# Altium footprint library tik_handheld_pcblib.PcbLib: 46 footprints (part 2 of 3)
Each footprint in its own frame and in the unit in brackets; x right, y up, seen from the top. Pads: shape width x height; smd on the part's side, far side on the other; paste and mask are expansions set on the pad; w line width, h text height; cw(c..) or ccw(c..) is an arc to the next point about the centre after c.
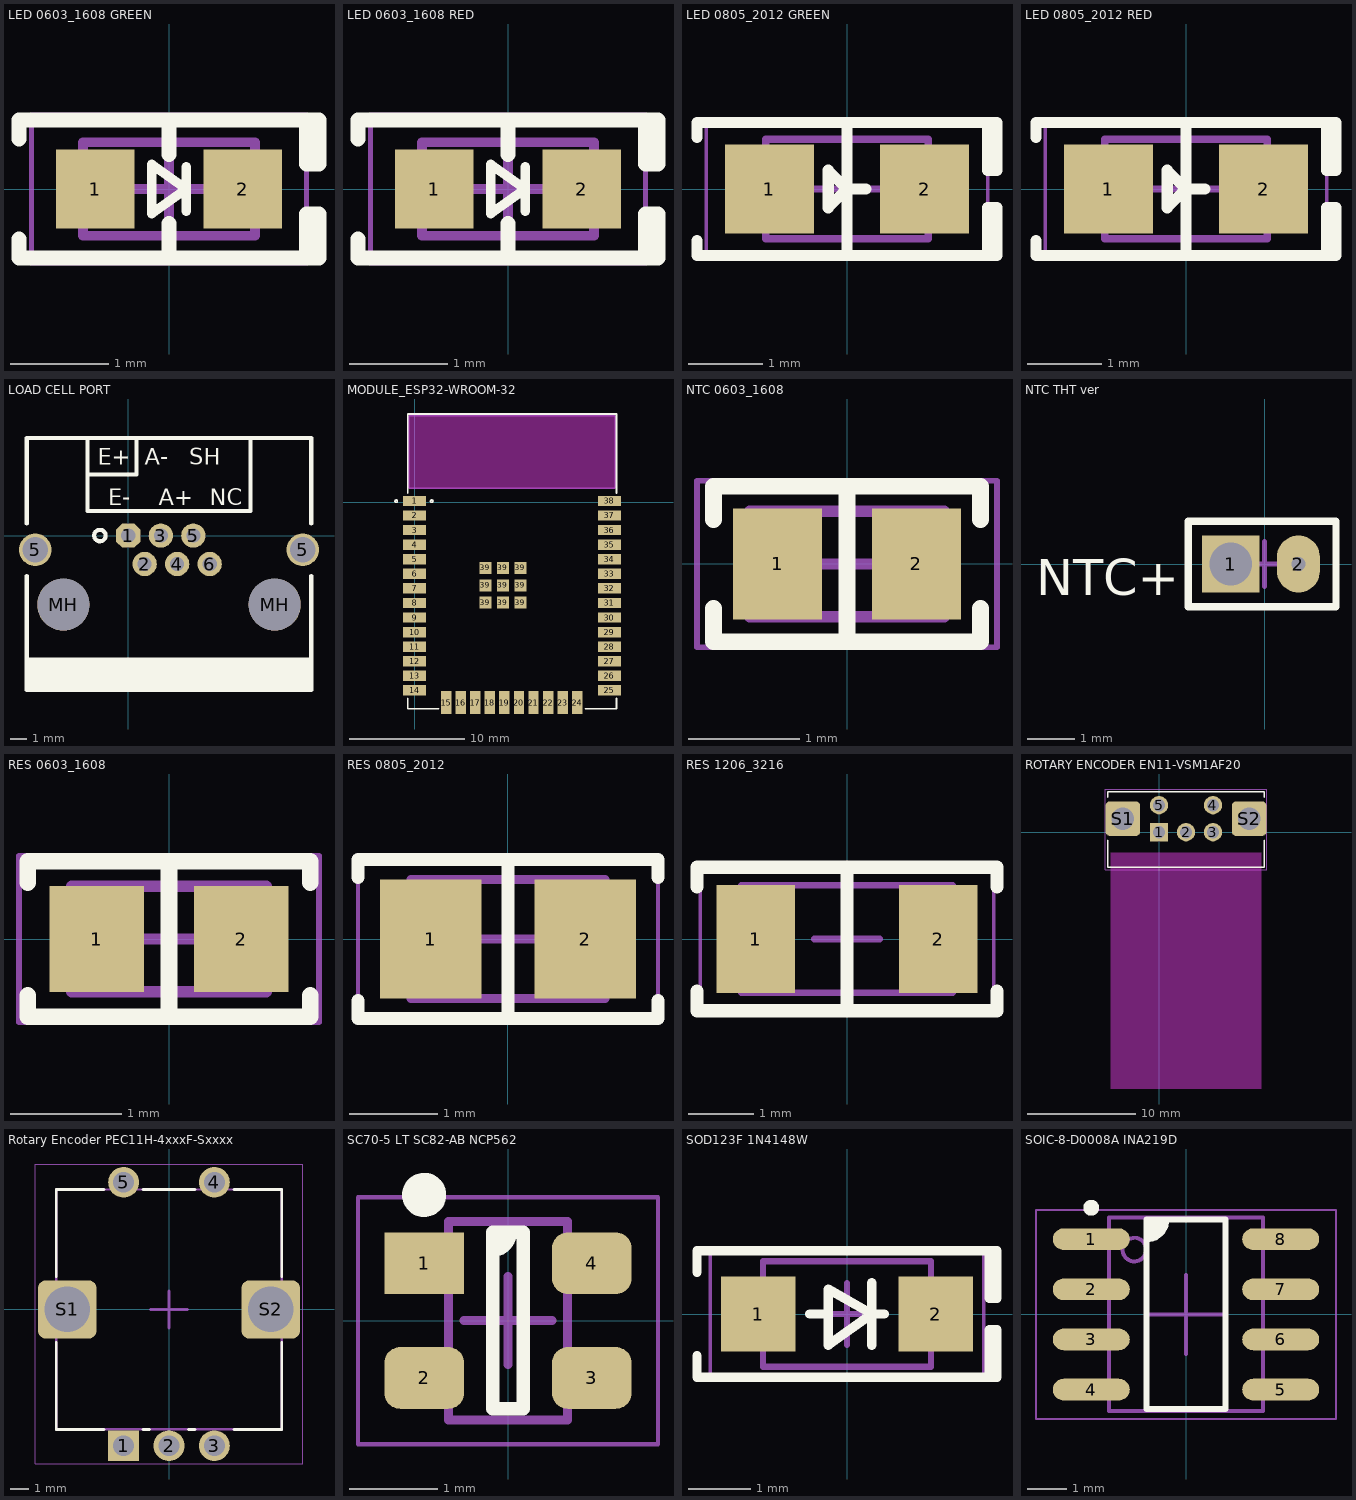
[diagram p1: the footprints below, top view; thin cyan lines are the x and y axes]

## LED 0603_1608 GREEN [mm] "Chip Diode, 2-Leads, Body 1.60x0.80mm, IPC Medium Density"
height 0.45
pads (2):
  rect 0.8x0.8 smd: 1(-0.75,0) 2(0.75,0)
Top Overlay:
  lines w0.1: 0.175,-0.225 0.175,0 ; 0.175,0.225 0.175,0 ; 0.175,0 -0.175,0.25 -0.175,0 -0.175,-0.25 0.175,0
  lines w0.15: -1.524,-0.508 -1.524,-0.7 1.5,-0.7 ; -1.524,0.508 -1.524,0.7 1.5,0.7 ; 0,-0.7 0,-0.35 ; 0,0.35 0,0.7 ; 1.397,-0.7 1.397,-0.254 1.524,-0.254 1.524,-0.7 1.397,-0.7 ; 1.397,0.254 1.397,0.7 1.524,0.7 1.524,0.254 1.397,0.254
Mechanical 13:
  lines w0.1: -0.875,-0.475 0.875,-0.475 0.875,0.475 -0.875,0.475 -0.875,-0.475
Mechanical 15:
  lines w0.05: -1.397,-0.75 1.397,-0.75 1.397,0.75 -1.397,0.75 -1.397,-0.75
  lines w0.1: -0.475,0 0.475,0 ; 0,-0.475 0,0.475
3D body "LED 0603 Base GREEN.STEP": height 0.28, standoff 0, extent -0.8,-0.4 0.8,0.4
3D body "LED 0603 Lens GREEN.STEP": height 0.53, standoff 0.18, extent -0.55,-0.4 0.55,0.4

## LED 0603_1608 RED [mm] "Chip Diode, 2-Leads, Body 1.60x0.80mm, IPC Medium Density"
height 0.45
pads (2):
  rect 0.8x0.8 smd: 1(-0.75,0) 2(0.75,0)
Top Overlay:
  lines w0.1: 0.175,-0.225 0.175,0 ; 0.175,0.225 0.175,0 ; 0.175,0 -0.175,-0.25 -0.175,0 -0.175,0.25 0.175,0
  lines w0.15: -1.524,-0.508 -1.524,-0.7 1.5,-0.7 ; -1.524,0.508 -1.524,0.7 1.5,0.7 ; 0,-0.7 0,-0.35 ; 0,0.35 0,0.7 ; 1.397,-0.7 1.397,-0.254 1.524,-0.254 1.524,-0.7 1.397,-0.7 ; 1.397,0.254 1.397,0.7 1.524,0.7 1.524,0.254 1.397,0.254
Mechanical 13:
  lines w0.1: -0.875,-0.475 0.875,-0.475 0.875,0.475 -0.875,0.475 -0.875,-0.475
Mechanical 15:
  lines w0.05: -1.397,-0.75 1.397,-0.75 1.397,0.75 -1.397,0.75 -1.397,-0.75
  lines w0.1: -0.475,0 0.475,0 ; 0,-0.475 0,0.475
3D body "LED 0603 Base RED.STEP": height 0.28, standoff 0, extent -0.8,-0.4 0.8,0.4
3D body "LED 0603 Lens RED.STEP": height 0.53, standoff 0.18, extent -0.55,-0.4 0.55,0.4

## LED 0805_2012 GREEN [mm] "Chip Diode, 2-Leads, Body 2.00x1.25mm, IPC Medium Density"
height 0.7
pads (2):
  rect 1.2x1.2 smd: 1(-1.05,0) 2(1.05,0)
Top Overlay:
  lines w0.15: -2.032,-0.7 -2.032,-0.9 1.905,-0.9 ; -2.032,0.7 -2.032,0.9 1.905,0.9 ; 0,-0.9 0,0.9 ; 0.254,0 0,0 ; 0,0 -0.254,0.254 -0.254,-0.254 0,0 ; 1.905,-0.9 1.905,-0.254 2.032,-0.254 2.032,-0.9 1.905,-0.9 ; 1.905,0.9 1.905,0.254 2.032,0.254 2.032,0.9 1.905,0.9
Mechanical 13:
  lines w0.1: -1.1,-0.675 1.1,-0.675 1.1,0.675 -1.1,0.675 -1.1,-0.675
Mechanical 15:
  lines w0.05: -1.905,-0.95 1.905,-0.95 1.905,0.95 -1.905,0.95 -1.905,-0.95
  lines w0.1: -0.5,0 0.5,0 ; 0,-0.5 0,0.5
3D body "LED 0805 Base GREEN.STEP": height 0.4, standoff 0, extent -1,-0.625 1,0.625
3D body "LED 0805 Lens GREEN.STEP": height 0.9, standoff 0.3, extent -0.65,-0.625 0.65,0.625

## LED 0805_2012 RED [mm] "Chip Diode, 2-Leads, Body 2.00x1.25mm, IPC Medium Density"
height 0.7
pads (2):
  rect 1.2x1.2 smd: 1(-1.05,0) 2(1.05,0)
Top Overlay:
  lines w0.15: -2.032,-0.7 -2.032,-0.9 1.905,-0.9 ; -2.032,0.7 -2.032,0.9 1.905,0.9 ; 0,-0.9 0,0.9 ; 0.254,0 0,0 ; 0,0 -0.254,0.254 -0.254,-0.254 0,0 ; 1.905,-0.9 2.032,-0.9 2.032,-0.254 1.905,-0.254 1.905,-0.9 ; 1.905,0.9 2.032,0.9 2.032,0.254 1.905,0.254 1.905,0.9
Mechanical 13:
  lines w0.1: -1.1,-0.675 -1.1,0.675 1.1,0.675 1.1,-0.675 -1.1,-0.675
Mechanical 15:
  lines w0.05: -1.905,-0.95 -1.905,0.95 1.905,0.95 1.905,-0.95 -1.905,-0.95
  lines w0.1: -0.5,0 0.5,0 ; 0,-0.5 0,0.5
3D body "LED 0805 Lens RED.STEP": height 0.9, standoff 0.3, extent -0.65,-0.625 0.65,0.625
3D body "LED 0805 Base RED.STEP": height 0.4, standoff 0, extent -1,-0.625 1,0.625

## LOAD CELL PORT [mil]
pads (10):
  oct 60x60 hole 35: 1(0,0)
  round 60 hole 35: 2(40,-70) 3(80,0) 4(120,-70) 5(160,0) 6(200,-70)
  round 80 hole 62: 5(-229,-35) 5(429,-35)
  round 128 hole 128 unplated: MH(-160,-170)
  round 128 hole 128: MH(360,-170)
Top Overlay:
  circle w10: c-70,0 r14.14
  rectangle: -250,-380 450,-300
  lines w10: -250,-100 -250,-380 450,-380 450,-100 ; -250,30 -250,240 450,240 450,30 ; -100,150 20,150 20,240 ; -100,60 300,60 300,240 -100,240 -100,60
  text "NC" at 200,74.01 h40
  text "E+" at -75,174.01 h40
  text "E-" at -50,74.01 h40
  text "A-" at 40,174.01 h40
  text "A+" at 75,74.01 h40
  text "SH" at 150,174.01 h40
Bottom Overlay:
  circle w10: c-70,0 r14.14
  lines w10: -100,150 20,150 20,240 ; -100,60 300,60 300,240 -100,240 -100,60
  text "E-" at 28.74,74.01 h40
  text "A+" at 153.74,74.01 h40
  text "NC" at 278.74,74.01 h40
  text "SH" at 228.74,174.01 h40
  text "A-" at 118.74,174.01 h40
  text "E+" at 3.74,174.01 h40
3D body "438600026.stp": height 524.5, standoff -143.92, extent -250.75,-377.99 450.76,241.51

## MODULE_ESP32-WROOM-32 [mm]
pads (47):
  rect 2x0.9 smd: 1(0,0.121) 2(0,-1.149) 3(0,-2.419) 4(0,-3.689) 5(0,-4.959) 6(0,-6.229) 7(0,-7.504) 8(0,-8.779) 9(0,-10.049) 10(0,-11.319) 11(0,-12.589) 12(0,-13.859) 13(0,-15.124) 14(0,-16.389) 25(17,-16.389) 26(17,-15.124) 27(17,-13.859) 28(17,-12.589) 29(17,-11.319) 30(17,-10.049) 31(17,-8.779) 32(17,-7.504) 33(17,-6.229) 34(17,-4.959) 35(17,-3.689) 36(17,-2.419) 37(17,-1.149) 38(17,0.121)
  rect 0.9x2 smd: 15(2.756,-17.46) 16(4.026,-17.46) 17(5.296,-17.46) 18(6.566,-17.46) 19(7.836,-17.46) 20(9.101,-17.46) 21(10.371,-17.46) 22(11.646,-17.46) 23(12.916,-17.46) 24(14.186,-17.46)
  rect 1.05x1.05 smd: 39(6.175,-8.755) 39(6.175,-7.244) 39(6.175,-5.725) 39(7.711,-8.755) 39(7.711,-7.244) 39(7.711,-5.725) 39(9.235,-8.755) 39(9.235,-7.244) 39(9.235,-5.725)
Top Overlay:
  circle w0.152: c-1.6,0.1 r0.102
  circle w0.152: c1.5,0.1 r0.102
  lines w0.152: -0.6,-17.1 -0.6,-18 2.1,-18 ; -0.6,0.8 -0.6,7.7 17.6,7.7 17.6,0.8 ; 14.9,-18 17.6,-18 17.6,-17.1
Keep-Out Layer:
  region: 17.5,1.24 -0.5,1.24 -0.5,7.54 17.5,7.54
  region: 17.5,1.24 -0.5,1.24 -0.5,7.54 17.5,7.54
Mechanical 13:
  lines w0.127: -0.5,1.24 -0.5,7.54 17.5,7.54 17.5,1.24 -0.5,1.24
  text "ANTENNA" at 2.5,3.79 h1.78
3D body "User Library-ESP321.STEP": height 2.91, standoff -0.01, extent -0.527,-17.892 17.473,7.608

## NTC 0603_1608 [mm] "NTC Thermistor, 2-Leads, Body 1.60x0.80mm, IPC Medium Density"
height 0.95
pads (2):
  rect 0.8x1 smd: 1(-0.625,0) 2(0.625,0)
Top Overlay:
  lines w0.152: -1.2,-0.4 -1.2,-0.7 1.2,-0.7 1.2,-0.4 ; -1.2,0.4 -1.2,0.7 1.2,0.7 1.2,0.4 ; 0,-0.7 0,0.7
Mechanical 13:
  lines w0.1: -0.875,-0.475 0.875,-0.475 0.875,0.475 -0.875,0.475 -0.875,-0.475
Mechanical 15:
  lines w0.05: -1.35,-0.75 1.35,-0.75 1.35,0.75 -1.35,0.75 -1.35,-0.75
  lines w0.1: -0.475,0 0.475,0 ; 0,-0.475 0,0.475
3D body "NTC 0603.STEP": height 0.82, standoff 0, extent -0.8,-0.412 0.8,0.412

## NTC THT ver [mm] "NTC Thermistor, 2-Leads, Body 1.60x0.80mm, IPC Medium Density"
height 0.95
pads (2):
  rect 1.2x1.2 hole 0.9 mask+0.127: 1(-0.711,0)
  oval 0.9x1.2 hole 0.3 mask+0.127: 2(0.711,0)
Top Overlay:
  lines w0.152: -1.6,-0.9 -1.6,0.9 1.5,0.9 1.5,-0.9 -1.6,-0.9
  text "NTC+" at -4.799,-0.66 h0.76
Bottom Overlay:
  lines w0.152: -1.6,-0.9 -1.6,0.9 1.5,0.9 1.5,-0.9 -1.6,-0.9
  text "NTC+" at -1.701,-0.533 h0.76
Mechanical 15:
  lines w0.05: -1.6,-0.9 1.5,-0.9 1.5,0.9 -1.6,0.9 -1.6,-0.9
  lines w0.1: -0.475,0 0.475,0 ; 0,-0.475 0,0.475

## RES 0603_1608 [mm] "Chip Resistor, 2-Leads, Body 1.60x0.80mm, IPC Medium Density"
height 0.45
pads (2):
  rect 0.85x0.95 smd: 1(-0.65,0) 2(0.65,0)
Top Overlay:
  lines w0.15: -1.27,-0.508 -1.27,-0.7 1.27,-0.7 1.27,-0.508 ; -1.27,0.508 -1.27,0.7 1.27,0.7 1.27,0.508 ; 0,-0.7 0,0.7
Mechanical 13:
  lines w0.1: -0.875,-0.475 -0.875,0.475 0.875,0.475 0.875,-0.475 -0.875,-0.475
Mechanical 15:
  lines w0.05: -1.35,-0.75 -1.35,0.75 1.35,0.75 1.35,-0.75 -1.35,-0.75
  lines w0.1: -0.475,0 0.475,0 ; 0,-0.475 0,0.475
3D body "0603 resistor.STEP": height 0.45, standoff 0, extent -0.8,-0.4 0.8,0.4

## RES 0805_2012 [mm] "Chip Resistor, 2-Leads, Body 2.00x1.25mm, IPC Medium Density"
height 0.7
pads (2):
  rect 1.15x1.35 smd: 1(-0.875,0) 2(0.875,0)
Top Overlay:
  lines w0.15: -1.7,-0.7 -1.7,-0.9 1.7,-0.9 1.7,-0.7 ; -1.7,0.7 -1.7,0.9 1.7,0.9 1.7,0.7 ; 0,-0.9 0,0.9
Mechanical 13:
  lines w0.1: -1.1,-0.675 1.1,-0.675 1.1,0.675 -1.1,0.675 -1.1,-0.675
Mechanical 15:
  lines w0.05: -1.7,-0.95 1.7,-0.95 1.7,0.95 -1.7,0.95 -1.7,-0.95
  lines w0.1: -0.5,0 0.5,0 ; 0,-0.5 0,0.5
3D body "0805 resistor.STEP": height 0.6, standoff 0, extent -1,-0.625 1,0.625

## RES 1206_3216 [mm] "Chip Resistor, 2-Leads, Body 3.13x1.55mm, IPC Medium Density"
height 0.7
pads (2):
  rect 1.2x1.65 smd: 1(-1.4,0) 2(1.4,0)
Top Overlay:
  lines w0.2: -2.3,-0.8 -2.3,-1.1 2.3,-1.1 2.3,-0.8 ; -2.3,0.8 -2.3,1.1 2.3,1.1 2.3,0.8 ; 0,-1.1 0,1.1
Mechanical 13:
  lines w0.1: -1.625,-0.825 -1.625,0.825 1.625,0.825 1.625,-0.825 -1.625,-0.825
Mechanical 15:
  lines w0.05: -2.25,-1.1 -2.25,1.1 2.25,1.1 2.25,-1.1 -2.25,-1.1
  lines w0.1: -0.5,0 0.5,0 ; 0,-0.5 0,0.5
3D body "1206 resistor.STEP": height 0.6, standoff 0, extent -1.6,-0.8 1.6,0.8

## ROTARY ENCODER EN11-VSM1AF20 [mm]
pads (7):
  rect 1.7x1.7 hole 1.15: 1(0,0)
  round 1.7 hole 1.15: 2(2.5,0) 3(5,0) 4(5,2.5) 5(0,2.5)
  rrect25% 3.2x3.2 hole 2.1 square: S1(-3.35,1.25) S2(8.35,1.25)
Top Overlay:
  lines w0.152: -4.75,-0.75 -4.75,-3.25 9.75,-3.25 9.75,-0.75 ; -4.75,3.25 -4.75,3.75 9.75,3.75 9.75,3.25
Keep-Out Layer:
  rectangle: -4.5,-23.8 9.5,-1.9
Mechanical 13:
  text "RE AXLE" at 3.012,-18.828 h1.52
Mechanical 15:
  lines w0.05: -5,-3.5 -5,4 10,4 10,-3.5 -5,-3.5
3D body "EC11B-SW-Horiz-20F-blue.step": height 13.75, standoff -3.5, extent -4.485,-23.75 9.486,3.25

## Rotary Encoder PEC11H-4xxxF-Sxxxx [mm]
pads (7):
  rect 1.7x1.7 hole 1.15: 1(-2.5,-7.5)
  round 1.7 hole 1.15: 2(0,-7.5) 3(2.5,-7.5) 4(2.5,7) 5(-2.5,7)
  rrect25% 3.2x3.2 hole 2.5 square: S1(-5.6,0) S2(5.6,0)
Top Overlay:
  lines w0.152: -6.2,-1.82 -6.2,-6.6 -3.575,-6.6 ; -6.2,1.82 -6.2,6.6 -3.575,6.6 ; -1.425,-6.6 -1.075,-6.6 ; -1.425,6.6 1.425,6.6 ; 1.075,-6.6 1.425,-6.6 ; 3.575,-6.6 6.2,-6.6 6.2,-1.82 ; 3.575,6.6 6.2,6.6 6.2,1.82
Mechanical 1:
  lines w0: -6.6,-1.05 -4.6,-1.05 -4.6,1.05 -6.6,1.05 -6.6,-1.05 ; 4.6,-1.05 6.6,-1.05 6.6,1.05 4.6,1.05 4.6,-1.05
Mechanical 13:
  lines w0.127: -6.2,-6.6 6.2,-6.6 6.2,6.6 -6.2,6.6 -6.2,-6.6
Mechanical 15:
  lines w0.05: -7.35,-8.505 7.35,-8.505 7.35,8.005 -7.35,8.005 -7.35,-8.505
  lines w0.152: -1.016,0 1.016,0 ; 0,-1.016 0,1.016
3D body "EC11B-SW-Vert-20F-blue.step": height 26.9, standoff -3.5, extent -6,-7.675 6,7.25

## SC70-5 LT SC82-AB NCP562 [mm] "SC70, SC82-AB, 4-Leads, Body 2.03x2.10mm, Pitch 0.65mm, IPC Medium Density"
height 1.1
pads (4):
  rect 0.9x0.7 smd: 1(-0.95,0.65)
  rrect50% 0.9x0.7 smd: 2(-0.95,-0.65) 3(0.95,-0.65) 4(0.95,0.65)
Top Overlay:
  circle w0.25: c-0.95,1.425 r0.125
  region: -0.19,1.025 -0.19,0.825 -0.15,0.825 -0.076,0.855 -0.02,0.912 0.01,0.985 0.01,1.025
  lines w0.152: -0.175,0.8 ccw(c-0.175,1) 0.025,1 ; -0.175,-1 0.175,-1 0.175,1 -0.175,1 -0.175,-1
Mechanical 13:
  lines w0.1: -0.675,-1.125 -0.675,1.125 0.675,1.125 0.675,-1.125 -0.675,-1.125
Mechanical 15:
  lines w0.05: -1.7,-1.4 -1.7,1.4 1.7,1.4 1.7,-1.4 -1.7,-1.4
  lines w0.1: -0.5,0 0.5,0 ; 0,-0.5 0,0.5
3D body "sc_82ab.step": height 1.1, standoff 0, extent -0.925,-1.035 0.925,0.965

## SOD123F 1N4148W [mm] "SODFL, 2-Leads, Body 1.60x3.50mm, IPC Medium Density"
height 1
pads (2):
  rect 1.2x1.2 smd: 1(-1.43,0) 2(1.43,0)
Top Overlay:
  lines w0.15: 2.286,-1.016 2.286,-0.254 2.413,-0.254 2.413,-1.016 2.286,-1.016 ; 2.286,0.254 2.413,0.254 2.413,1.016 2.286,1.016 2.286,0.254
  lines w0.152: -2.413,-0.675 -2.413,-1.016 2.286,-1.016 ; -2.413,0.675 -2.413,1.016 2.286,1.016 ; -0.6,0 -0.3,0 ; 0.4,-0.5 0.4,0.5 ; 0.6,0 0.4,0 ; 0.4,0 -0.3,-0.5 -0.3,0.4 0.4,0
Mechanical 13:
  lines w0.1: -1.35,-0.85 1.35,-0.85 1.35,0.85 -1.35,0.85 -1.35,-0.85
Mechanical 15:
  lines w0.05: -2.2,-1 2.2,-1 2.2,1 -2.2,1 -2.2,-1
  lines w0.1: -0.5,0 0.5,0 ; 0,-0.5 0,0.5
3D body "SOD123F.STEP": height 1.1, standoff 0, extent -1.75,-0.8 1.75,0.8

## SOIC-8-D0008A INA219D [mm] "Package SOIC-8, 8-Leades, 4.90 x 3.89 mm Body , Pitch 1.27 mm"
height 1.75
pads (8):
  oval 1.95x0.55 smd: 1(-2.4,1.905) 2(-2.4,0.635) 3(-2.4,-0.635) 4(-2.4,-1.905) 5(2.4,-1.905) 6(2.4,-0.635) 7(2.4,0.635) 8(2.4,1.905)
Top Overlay:
  circle w0.2: c-2.4,2.7 r0.1
  region: -1,2.4 -0.5,2.4 -0.5,2.2 -0.8,1.9 -1,1.9
  lines w0.152: -1,1.9 ccw(c-1,2.4) -0.5,2.4 ; -1,-2.4 1,-2.4 1,2.4 -1,2.4 -1,-2.4
Mechanical 13:
  circle w0.1: c-1.309,1.641 r0.3
  lines w0.1: -1.947,-2.452 -1.947,2.452 1.947,2.452 1.947,-2.452 -1.947,-2.452
Mechanical 15:
  lines w0.05: -3.8,-2.65 -3.8,2.65 3.8,2.65 3.8,-2.65 -3.8,-2.65
  lines w0.1: -1,0 0,0 ; 0,-1 0,0 ; 0,1 0,0 ; 1,0 0,0
3D body "TI - SOIC-8 - D008A v3.STEP": height 1.75, standoff 0, extent -3,-2.452 3,2.452